# Altium footprint library SomoPowerPackControl.PcbLib: 145 footprints (part 10 of 10)
Each footprint in its own frame and in the unit in brackets; x right, y up, seen from the top. Pads: shape width x height; smd on the part's side, far side on the other; paste and mask are expansions set on the pad; w line width, h text height; cw(c..) or ccw(c..) is an arc to the next point about the centre after c.
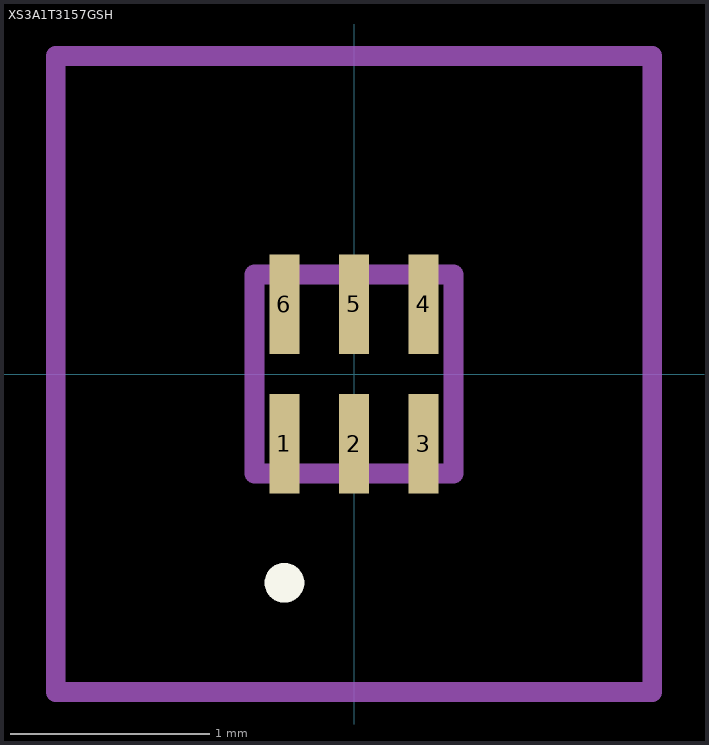
[diagram p9: the footprint, top view; thin cyan lines are the x and y axes]

## XS3A1T3157GSH [mm]
pads (6):
  rect 0.15x0.5 smd: 1(-0.35,-0.35) 2(0,-0.35) 3(0.35,-0.35) 4(0.35,0.35) 5(0,0.35) 6(-0.35,0.35)
Top Overlay:
  lines w0.1: -0.35,-1.1 cw(c-0.35,-1.05) -0.35,-1 cw(c-0.35,-1.05) -0.35,-1.1
Mechanical 13:
  lines w0.1: -0.5,-0.5 0.5,-0.5 0.5,0.5 -0.5,0.5 -0.5,-0.5
Mechanical 15:
  lines w0.1: -1.5,-1.6 1.5,-1.6 1.5,1.6 -1.5,1.6 -1.5,-1.6
3D body "XS3A1T3157GSH.stp": height 0.45, standoff 0, extent -0.5,-0.5 0.5,0.5